# Altium footprint library 4.02-2.54mm排针-排母.PcbLib: 177 footprints (part 12 of 12)
Each footprint in its own frame and in the unit in brackets; x right, y up, seen from the top. Pads: shape width x height; smd on the part's side, far side on the other; paste and mask are expansions set on the pad; w line width, h text height; cw(c..) or ccw(c..) is an arc to the next point about the centre after c.
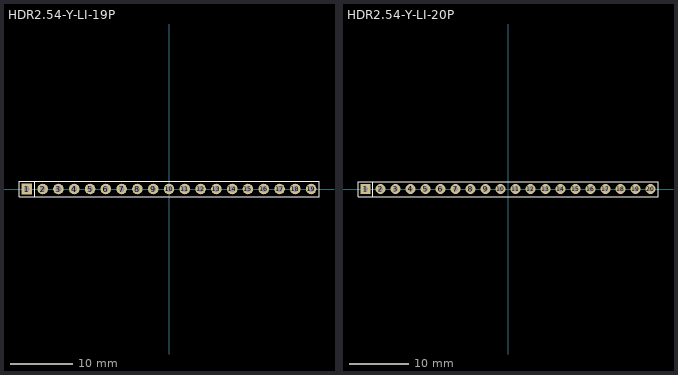
[diagram p11: the footprints below, top view; thin cyan lines are the x and y axes]

## HDR2.54-Y-LI-19P [mm] "[ PCBѧϰȺ514746572 ]"
pads (19):
  rect 1.7x1.7 hole 0.9: 1(-22.86,0)
  round 1.7 hole 0.9: 2(-20.32,0) 3(-17.78,0) 4(-15.24,0) 5(-12.7,0) 6(-10.16,0) 7(-7.62,0) 8(-5.08,0) 9(-2.54,0) 10(0,0) 11(2.54,0) 12(5.08,0) 13(7.62,0) 14(10.16,0) 15(12.7,0) 16(15.24,0) 17(17.78,0) 18(20.32,0) 19(22.86,0)
Top Overlay:
  lines w0.2: -21.61,-1.25 -21.61,1.25 ; -24.13,-1.27 24.13,-1.27 24.13,1.27 -22.225,1.27 -24.13,1.27 -24.13,-1.27
3D body "HDR-1P_Y.STEP": height 4.31, standoff -3, extent 21.59,-1.27 24.13,1.27
3D body "HDR-1P_Y.STEP": height 4.31, standoff -3, extent 19.05,-1.27 21.59,1.27
3D body "HDR-1P_Y.STEP": height 4.31, standoff -3, extent 16.51,-1.27 19.05,1.27
3D body "HDR-1P_Y.STEP": height 4.31, standoff -3, extent 13.97,-1.27 16.51,1.27
3D body "HDR-1P_Y.STEP": height 4.31, standoff -3, extent 11.43,-1.27 13.97,1.27
3D body "HDR-1P_Y.STEP": height 4.31, standoff -3, extent 8.89,-1.27 11.43,1.27
3D body "HDR-1P_Y.STEP": height 4.31, standoff -3, extent 6.35,-1.27 8.89,1.27
3D body "HDR-1P_Y.STEP": height 4.31, standoff -3, extent 3.81,-1.27 6.35,1.27
3D body "HDR-1P_Y.STEP": height 4.31, standoff -3, extent 1.27,-1.27 3.81,1.27
3D body "HDR-1P_Y.STEP": height 4.31, standoff -3, extent -1.27,-1.27 1.27,1.27
3D body "HDR-1P_Y.STEP": height 4.31, standoff -3, extent -3.81,-1.27 -1.27,1.27
3D body "HDR-1P_Y.STEP": height 4.31, standoff -3, extent -6.35,-1.27 -3.81,1.27
3D body "HDR-1P_Y.STEP": height 4.31, standoff -3, extent -8.89,-1.27 -6.35,1.27
3D body "HDR-1P_Y.STEP": height 4.31, standoff -3, extent -11.43,-1.27 -8.89,1.27
3D body "HDR-1P_Y.STEP": height 4.31, standoff -3, extent -13.97,-1.27 -11.43,1.27
3D body "HDR-1P_Y.STEP": height 4.31, standoff -3, extent -16.51,-1.27 -13.97,1.27
3D body "HDR-1P_Y.STEP": height 4.31, standoff -3, extent -19.05,-1.27 -16.51,1.27
3D body "HDR-1P_Y.STEP": height 4.31, standoff -3, extent -21.59,-1.27 -19.05,1.27
3D body "HDR-1P_Y.STEP": height 4.31, standoff -3, extent -24.13,-1.27 -21.59,1.27

## HDR2.54-Y-LI-20P [mm] "[ PCBѧϰȺ514746572 ]"
pads (20):
  rect 1.7x1.7 hole 0.9: 1(-24.13,0)
  round 1.7 hole 0.9: 2(-21.59,0) 3(-19.05,0) 4(-16.51,0) 5(-13.97,0) 6(-11.43,0) 7(-8.89,0) 8(-6.35,0) 9(-3.81,0) 10(-1.27,0) 11(1.27,0) 12(3.81,0) 13(6.35,0) 14(8.89,0) 15(11.43,0) 16(13.97,0)
  round 1.7 hole 0.762: 17(16.51,0) 18(19.05,0) 19(21.59,0) 20(24.13,0)
Top Overlay:
  lines w0.2: -22.88,-1.25 -22.88,1.25 ; -25.4,-1.27 25.4,-1.27 25.4,1.27 -23.495,1.27 -25.4,1.27 -25.4,-1.27
3D body "HDR-1P_Y.STEP": height 4.31, standoff -3, extent -25.4,-1.27 -22.86,1.27
3D body "HDR-1P_Y.STEP": height 4.31, standoff -3, extent -22.86,-1.27 -20.32,1.27
3D body "HDR-1P_Y.STEP": height 4.31, standoff -3, extent -20.32,-1.27 -17.78,1.27
3D body "HDR-1P_Y.STEP": height 4.31, standoff -3, extent -17.78,-1.27 -15.24,1.27
3D body "HDR-1P_Y.STEP": height 4.31, standoff -3, extent -15.24,-1.27 -12.7,1.27
3D body "HDR-1P_Y.STEP": height 4.31, standoff -3, extent -12.7,-1.27 -10.16,1.27
3D body "HDR-1P_Y.STEP": height 4.31, standoff -3, extent -10.16,-1.27 -7.62,1.27
3D body "HDR-1P_Y.STEP": height 4.31, standoff -3, extent -7.62,-1.27 -5.08,1.27
3D body "HDR-1P_Y.STEP": height 4.31, standoff -3, extent -5.08,-1.27 -2.54,1.27
3D body "HDR-1P_Y.STEP": height 4.31, standoff -3, extent -2.54,-1.27 0,1.27
3D body "HDR-1P_Y.STEP": height 4.31, standoff -3, extent 0,-1.27 2.54,1.27
3D body "HDR-1P_Y.STEP": height 4.31, standoff -3, extent 2.54,-1.27 5.08,1.27
3D body "HDR-1P_Y.STEP": height 4.31, standoff -3, extent 5.08,-1.27 7.62,1.27
3D body "HDR-1P_Y.STEP": height 4.31, standoff -3, extent 7.62,-1.27 10.16,1.27
3D body "HDR-1P_Y.STEP": height 4.31, standoff -3, extent 10.16,-1.27 12.7,1.27
3D body "HDR-1P_Y.STEP": height 4.31, standoff -3, extent 12.7,-1.27 15.24,1.27
3D body "HDR-1P_Y.STEP": height 4.31, standoff -3, extent 15.24,-1.27 17.78,1.27
3D body "HDR-1P_Y.STEP": height 4.31, standoff -3, extent 17.78,-1.27 20.32,1.27
3D body "HDR-1P_Y.STEP": height 4.31, standoff -3, extent 20.32,-1.27 22.86,1.27
3D body "HDR-1P_Y.STEP": height 4.31, standoff -3, extent 22.86,-1.27 25.4,1.27